# Altium footprint library Wurth_Elektronik_Electromechanic_Wire_to_Board_Connectors_rev16a.PCBLIB: 662 footprints (part 19 of 42)
Each footprint in its own frame and in the unit in brackets; x right, y up, seen from the top. Pads: shape width x height; smd on the part's side, far side on the other; paste and mask are expansions set on the pad; w line width, h text height; cw(c..) or ccw(c..) is an arc to the next point about the centre after c.
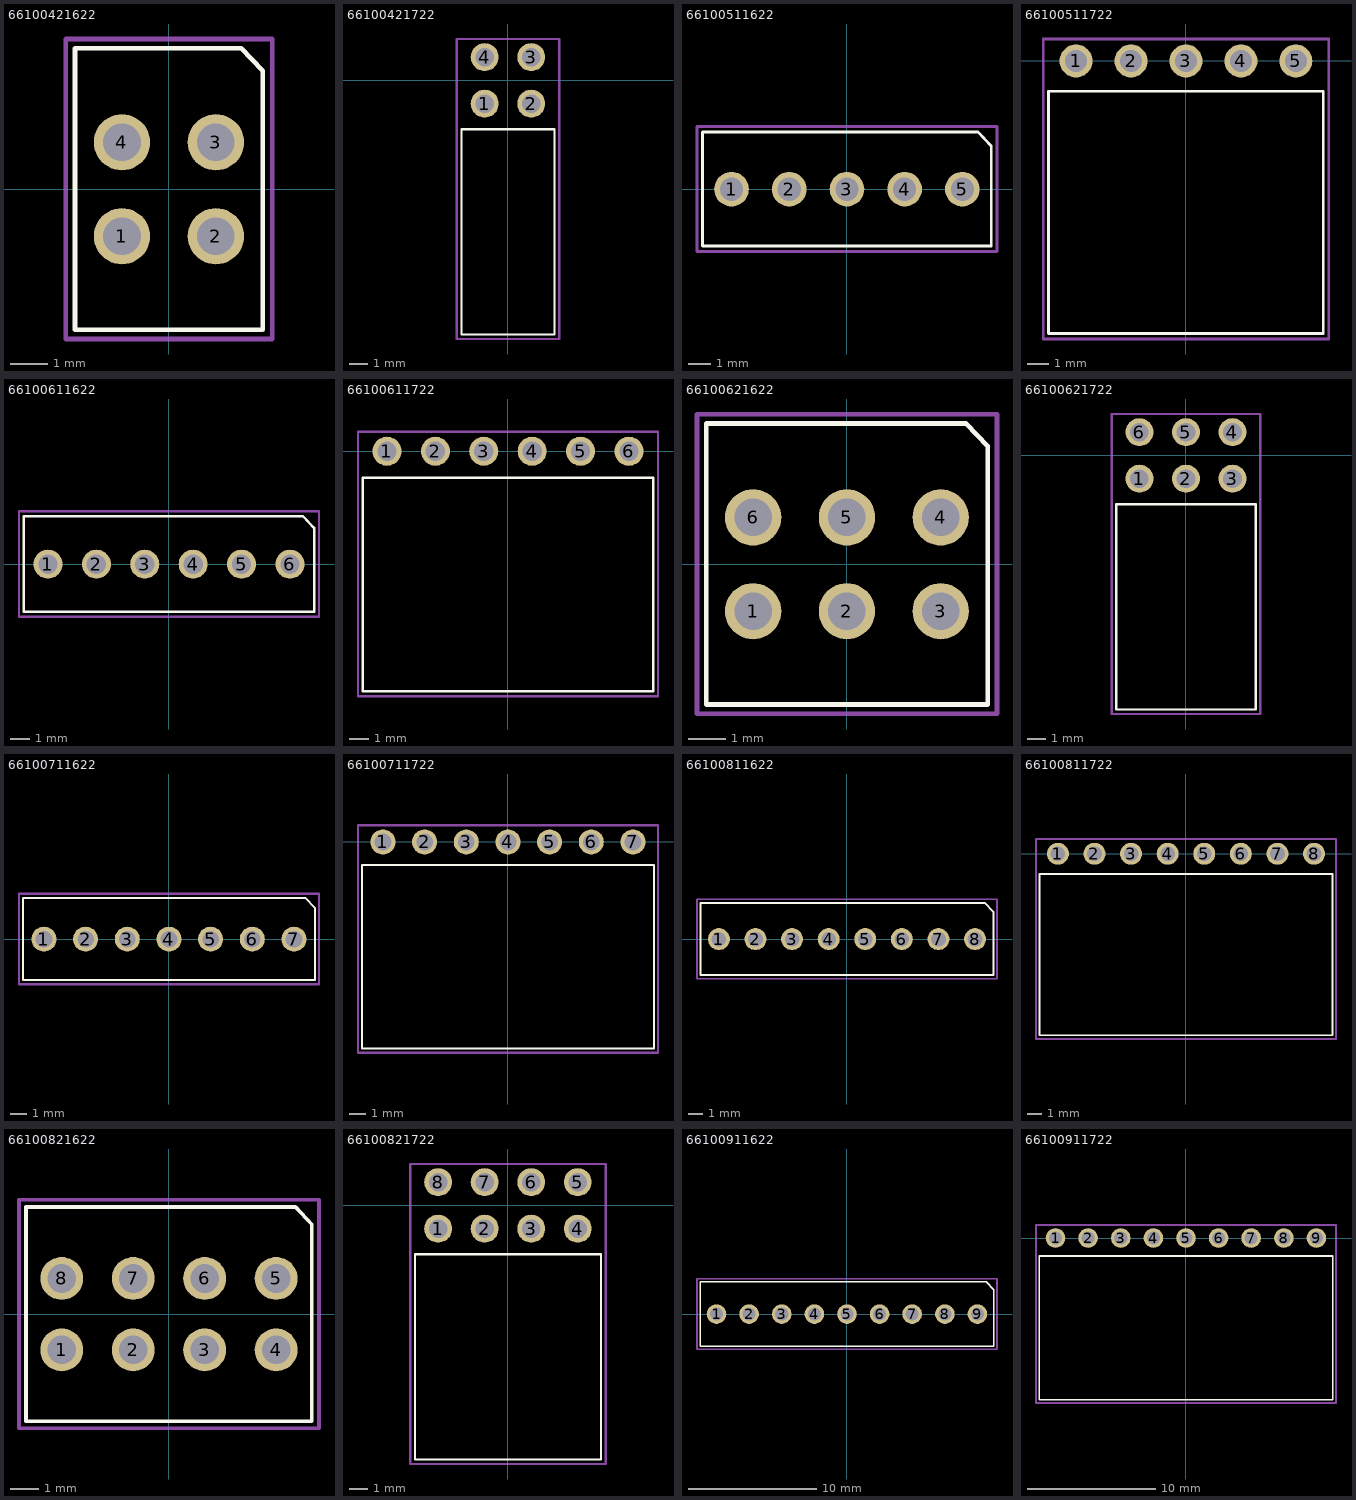
[diagram p18: the footprints below, top view; thin cyan lines are the x and y axes]

## 66100421622 [mil]
pads (4):
  round 60 hole 40: 1(-50,-50) 2(50,-50) 3(50,50) 4(-50,50)
Top Overlay:
  lines w5: -100,-149.61 100,-149.61 100,126 77,150 -100,150 -100,-149.61
Mechanical 2:
  text ">Name" at -99.61,187 h77.5
Mechanical 4:
  text ">Value" at -99.61,-225.98 h77.5
Mechanical 27:
  lines w5: -109.84,-159.45 110,-159.45 110,160 -109.84,160 -109.84,-159.45

## 66100421722 [mil]
pads (4):
  round 60 hole 40: 1(-50,-50) 2(50,-50) 3(50,50) 4(-50,50)
Top Overlay:
  lines w5: -100,-546.06 100,-546.06 100,-105.12 -100,-105.12 -100,-546.06
Mechanical 2:
  text ">Name" at -100,127 h77.5
Mechanical 4:
  text ">Value" at -92.52,-626.38 h77.5
Mechanical 27:
  lines w5: -109.84,-555.91 -109.84,89 110,89 110,-555.91 -109.84,-555.91

## 66100511622 [mil]
pads (5):
  round 60 hole 40: 1(-200,0) 2(-100,0) 3(0,0) 4(100,0) 5(200,0)
Top Overlay:
  lines w5: -250,-98.43 250,-98.43 250,75 227,99 -250,99 -250,-98.43
Mechanical 2:
  text ">Name" at -99.61,130 h77.5
Mechanical 4:
  text ">Value" at -95.67,-169.29 h77.5
Mechanical 27:
  lines w5: -259.84,-108.27 260,-108.27 260,109 -259.84,109 -259.84,-108.27

## 66100511722 [mil]
pads (5):
  round 60 hole 40: 1(-200,0) 2(-100,0) 3(0,0) 4(100,0) 5(200,0)
Top Overlay:
  lines w5: -250,-496.06 250,-496.06 250,-55.12 -250,-55.12 -250,-496.06
Mechanical 2:
  text ">Name" at -100,100 h77.5
Mechanical 4:
  text ">Value" at -100,-600 h77.5
Mechanical 27:
  lines w5: -259.84,-505.91 -259.84,40 260,40 260,-505.91 -259.84,-505.91

## 66100611622 [mil]
pads (6):
  round 60 hole 40: 1(-250,0) 2(-150,0) 3(-50,0) 4(50,0) 5(150,0) 6(250,0)
Top Overlay:
  lines w5: -300,-98.43 300,-98.43 300,75 277,99 -300,99 -300,-98.43
Mechanical 2:
  text ">Name" at -149.61,130 h77.5
Mechanical 4:
  text ">Value" at -145.67,-169.29 h77.5
Mechanical 27:
  lines w5: -309.84,-108.27 310,-108.27 310,109 -309.84,109 -309.84,-108.27

## 66100611722 [mil]
pads (6):
  round 60 hole 40: 1(-250,0) 2(-150,0) 3(-50,0) 4(50,0) 5(150,0) 6(250,0)
Top Overlay:
  lines w5: -300,-496.06 300,-496.06 300,-55.12 -300,-55.12 -300,-496.06
Mechanical 2:
  text ">Name" at -100,100 h77.5
Mechanical 4:
  text ">Value" at -100,-600 h77.5
Mechanical 27:
  lines w5: -309.84,-505.91 -309.84,40 310,40 310,-505.91 -309.84,-505.91

## 66100621622 [mil]
pads (6):
  round 60 hole 40: 1(-100,-50) 2(0,-50) 3(100,-50) 4(100,50) 5(0,50) 6(-100,50)
Top Overlay:
  lines w5: -150,-149.61 150,-149.61 150,126 127,150 -150,150 -150,-149.61
Mechanical 2:
  text ">Name" at -120.47,187 h77.5
Mechanical 4:
  text ">Value" at -112.6,-218.11 h77.5
Mechanical 27:
  lines w5: -159.84,-159.45 160,-159.45 160,160 -159.84,160 -159.84,-159.45

## 66100621722 [mil]
pads (6):
  round 60 hole 40: 1(-100,-50) 2(0,-50) 3(100,-50) 4(100,50) 5(0,50) 6(-100,50)
Top Overlay:
  lines w5: -150,-546.06 150,-546.06 150,-105.12 -150,-105.12 -150,-546.06
Mechanical 2:
  text ">Name" at -100,127 h77.5
Mechanical 4:
  text ">Value" at -92.52,-626.38 h77.5
Mechanical 27:
  lines w5: -159.84,-555.91 -159.84,89 160,89 160,-555.91 -159.84,-555.91

## 66100711622 [mil]
pads (7):
  round 60 hole 40: 1(-300,0) 2(-200,0) 3(-100,0) 4(0,0) 5(100,0) 6(200,0) 7(300,0)
Top Overlay:
  lines w5: -350,-98.43 350,-98.43 350,75 327,99 -350,99 -350,-98.43
Mechanical 2:
  text ">Name" at -149.61,130 h77.5
Mechanical 4:
  text ">Value" at -145.67,-169.29 h77.5
Mechanical 27:
  lines w5: -359.84,-108.27 360,-108.27 360,109 -359.84,109 -359.84,-108.27

## 66100711722 [mil]
pads (7):
  round 60 hole 40: 1(-300,0) 2(-200,0) 3(-100,0) 4(0,0) 5(100,0) 6(200,0) 7(300,0)
Top Overlay:
  lines w5: -350,-496.06 350,-496.06 350,-55.12 -350,-55.12 -350,-496.06
Mechanical 2:
  text ">Name" at -100,100 h77.5
Mechanical 4:
  text ">Value" at -100,-600 h77.5
Mechanical 27:
  lines w5: -359.84,-505.91 -359.84,40 360,40 360,-505.91 -359.84,-505.91

## 66100811622 [mil]
pads (8):
  round 60 hole 40: 1(-350,0) 2(-250,0) 3(-150,0) 4(-50,0) 5(50,0) 6(150,0) 7(250,0) 8(350,0)
Top Overlay:
  lines w5: -400,-98.43 400,-98.43 400,75 377,99 -400,99 -400,-98.43
Mechanical 2:
  text ">Name" at -149.61,130 h77.5
Mechanical 4:
  text ">Value" at -145.67,-169.29 h77.5
Mechanical 27:
  lines w5: -409.84,-108.27 410,-108.27 410,109 -409.84,109 -409.84,-108.27

## 66100811722 [mil]
pads (8):
  round 60 hole 40: 1(-350,0) 2(-250,0) 3(-150,0) 4(-50,0) 5(50,0) 6(150,0) 7(250,0) 8(350,0)
Top Overlay:
  lines w5: -400,-496.06 400,-496.06 400,-55.12 -400,-55.12 -400,-496.06
Mechanical 2:
  text ">Name" at -107.87,69 h77.5
Mechanical 4:
  text ">Value" at -111.81,-572.44 h77.5
Mechanical 27:
  lines w5: -409.84,-505.91 -409.84,40 410,40 410,-505.91 -409.84,-505.91

## 66100821622 [mil]
pads (8):
  round 60 hole 40: 1(-150,-50) 2(-50,-50) 3(50,-50) 4(150,-50) 5(150,50) 6(50,50) 7(-50,50) 8(-150,50)
Top Overlay:
  lines w5: -200,-149.61 200,-149.61 200,126 177,150 -200,150 -200,-149.61
Mechanical 2:
  text ">Name" at -109.84,187 h77.5
Mechanical 4:
  text ">Value" at -93.31,-222.44 h77.5
Mechanical 27:
  lines w5: -209.84,-159.45 210,-159.45 210,160 -209.84,160 -209.84,-159.45

## 66100821722 [mil]
pads (8):
  round 60 hole 40: 1(-150,-50) 2(-50,-50) 3(50,-50) 4(150,-50) 5(150,50) 6(50,50) 7(-50,50) 8(-150,50)
Top Overlay:
  lines w5: -200,-546.06 200,-546.06 200,-105.12 -200,-105.12 -200,-546.06
Mechanical 2:
  text ">Name" at -72.44,115 h77.5
Mechanical 4:
  text ">Value" at -67.32,-622.44 h77.5
Mechanical 27:
  lines w5: -209.84,-555.91 -209.84,89 210,89 210,-555.91 -209.84,-555.91

## 66100911622 [mil]
pads (9):
  round 60 hole 40: 1(-400,0) 2(-300,0) 3(-200,0) 4(-100,0) 5(0,0) 6(100,0) 7(200,0) 8(300,0) 9(400,0)
Top Overlay:
  lines w5: -450,-98.43 450,-98.43 450,75 427,99 -450,99 -450,-98.43
Mechanical 2:
  text ">Name" at -149.61,130 h77.5
Mechanical 4:
  text ">Value" at -145.67,-169.29 h77.5
Mechanical 27:
  lines w5: -459.84,-108.27 460,-108.27 460,109 -459.84,109 -459.84,-108.27

## 66100911722 [mil]
pads (9):
  round 60 hole 40: 1(-400,0) 2(-300,0) 3(-200,0) 4(-100,0) 5(0,0) 6(100,0) 7(200,0) 8(300,0) 9(400,0)
Top Overlay:
  lines w5: -450,-496.06 450,-496.06 450,-55.12 -450,-55.12 -450,-496.06
Mechanical 2:
  text ">Name" at -100,73 h77.5
Mechanical 4:
  text ">Value" at -96.06,-580.32 h77.5
Mechanical 27:
  lines w5: -459.84,-505.91 -459.84,40 460,40 460,-505.91 -459.84,-505.91